# Altium footprint library Connector.PcbLib: 59 footprints (part 3 of 4)
Each footprint in its own frame and in the unit in brackets; x right, y up, seen from the top. Pads: shape width x height; smd on the part's side, far side on the other; paste and mask are expansions set on the pad; w line width, h text height; cw(c..) or ccw(c..) is an arc to the next point about the centre after c.
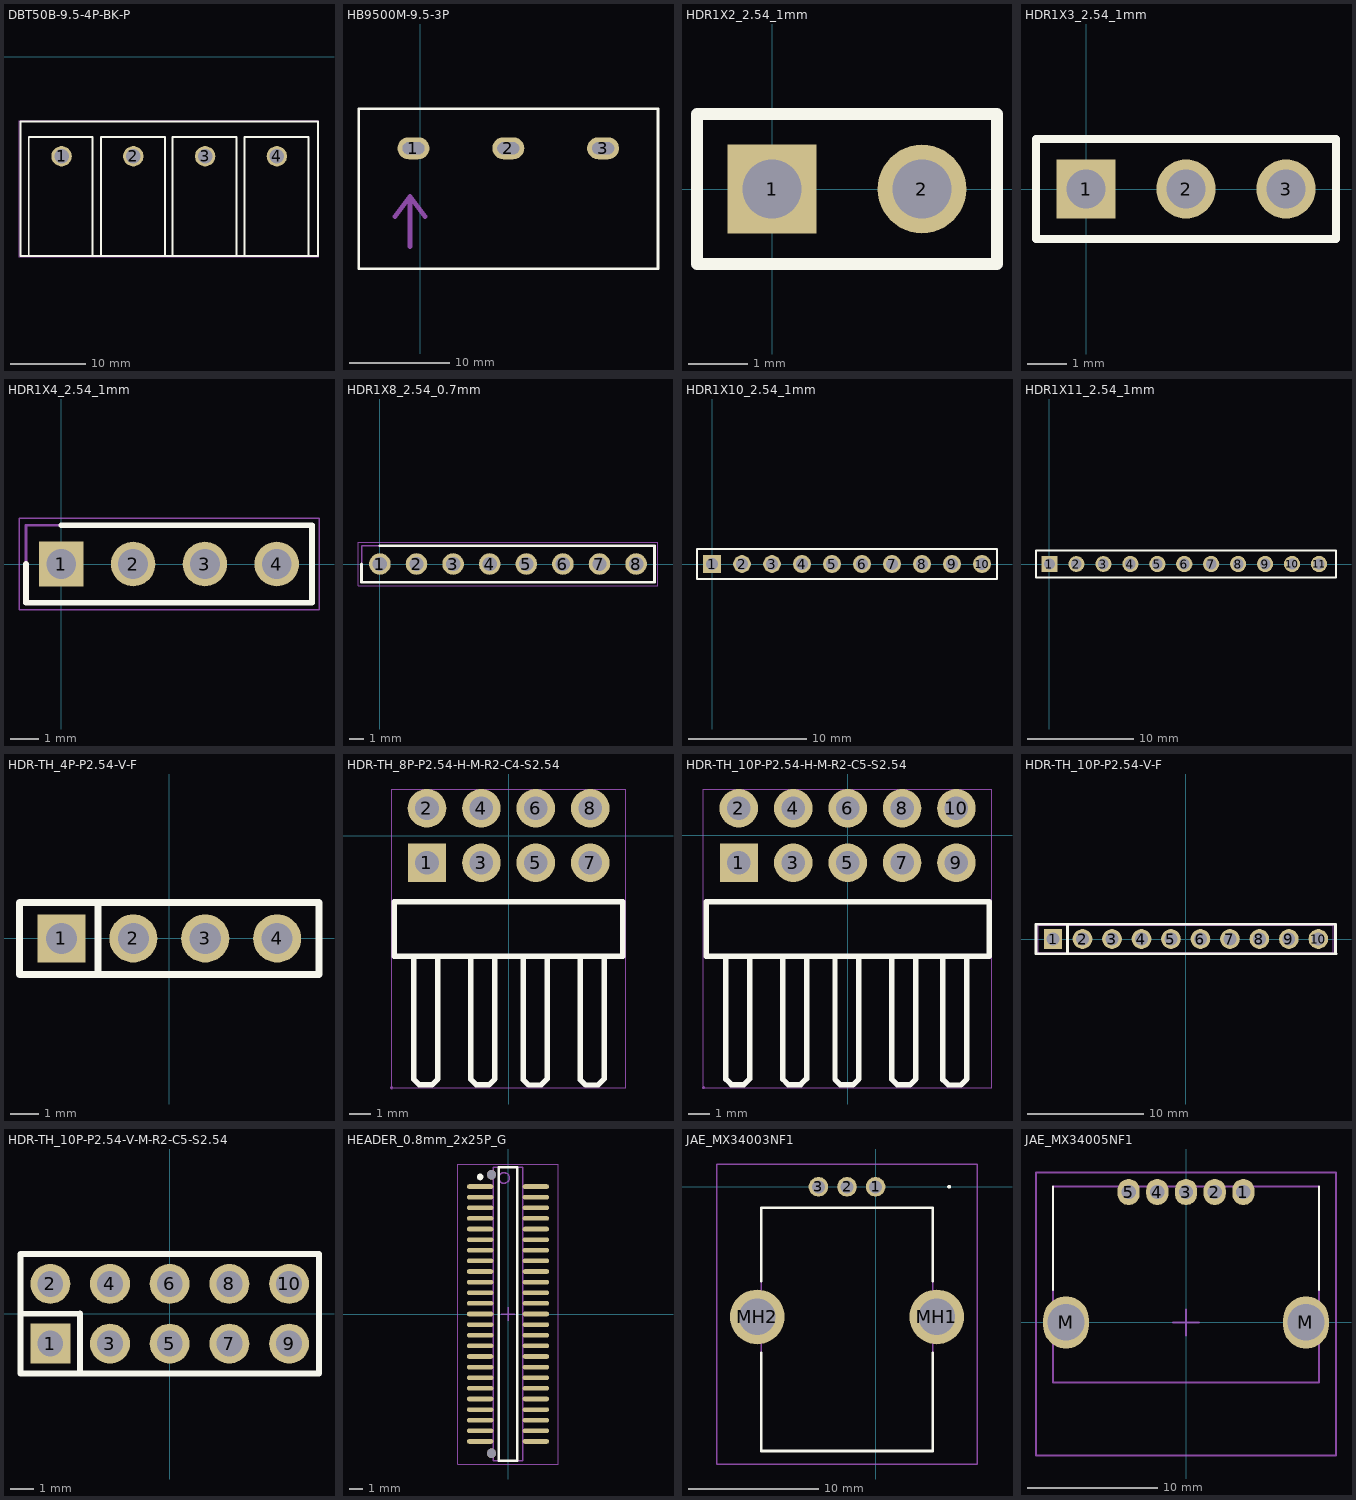
[diagram p2: the footprints below, top view; thin cyan lines are the x and y axes]

## DBT50B-9.5-4P-BK-P [mil]
pads (4):
  round 106.3 hole 74.8 mask+2: 1(1857,-517.6) 2(2231,-517.6) 3(2605,-517.6) 4(2979,-517.6)
Top Overlay:
  lines w10: 1685.9,-1037.3 1685.9,-417.6 2018,-417.6 2018,-1037.3 ; 2063,-1037.6 2063,-417.9 2395.2,-417.9 2395.2,-1037.6 ; 2436,-1037.6 2436,-417.9 2768.1,-417.9 2768.1,-1037.6 ; 2811,-1037.6 2811,-417.9 3143.1,-417.9 3143.1,-1037.6 ; 1642.4,-1037.3 1642.4,-336.5 3193.6,-336.5 3193.6,-1037.3 1642.4,-1037.3
Mechanical 15:
  region: 1890.5,-517.6 1890.5,-513.19 1888.22,-504.67 1883.81,-497.03 1877.57,-490.79 1869.93,-486.38 1861.41,-484.1 1852.59,-484.1 1844.07,-486.38 1836.43,-490.79 1830.19,-497.03 1825.78,-504.67 1823.5,-513.19 1823.5,-517.6 1823.5,-522.01 1825.78,-530.53 1830.19,-538.17 1836.43,-544.41 1844.07,-548.82 1852.59,-551.1 1861.41,-551.1 1869.93,-548.82 1877.57,-544.41 1883.81,-538.17 1888.22,-530.53 1890.5,-522.01
  region: 2264.5,-517.6 2264.5,-513.19 2262.22,-504.67 2257.81,-497.03 2251.57,-490.79 2243.93,-486.38 2235.41,-484.1 2226.59,-484.1 2218.07,-486.38 2210.43,-490.79 2204.19,-497.03 2199.78,-504.67 2197.5,-513.19 2197.5,-517.6 2197.5,-522.01 2199.78,-530.53 2204.19,-538.17 2210.43,-544.41 2218.07,-548.82 2226.59,-551.1 2235.41,-551.1 2243.93,-548.82 2251.57,-544.41 2257.81,-538.17 2262.22,-530.53 2264.5,-522.01
  region: 2638.5,-517.6 2638.5,-513.19 2636.22,-504.67 2631.81,-497.03 2625.57,-490.79 2617.93,-486.38 2609.41,-484.1 2600.59,-484.1 2592.07,-486.38 2584.43,-490.79 2578.19,-497.03 2573.78,-504.67 2571.5,-513.19 2571.5,-517.6 2571.5,-522.01 2573.78,-530.53 2578.19,-538.17 2584.43,-544.41 2592.07,-548.82 2600.59,-551.1 2609.41,-551.1 2617.93,-548.82 2625.57,-544.41 2631.81,-538.17 2636.22,-530.53 2638.5,-522.01
  region: 3012.5,-517.6 3012.5,-513.19 3010.22,-504.67 3005.81,-497.03 2999.57,-490.79 2991.93,-486.38 2983.41,-484.1 2974.59,-484.1 2966.07,-486.38 2958.43,-490.79 2952.19,-497.03 2947.78,-504.67 2945.5,-513.19 2945.5,-517.6 2945.5,-522.01 2947.78,-530.53 2952.19,-538.17 2958.43,-544.41 2966.07,-548.82 2974.59,-551.1 2983.41,-551.1 2991.93,-548.82 2999.57,-544.41 3005.81,-538.17 3010.22,-530.53 3012.5,-522.01
  region: 1639.8,-1042.6 1639.8,-1041.61 1638.39,-1040.2 1636.41,-1040.2 1635,-1041.61 1635,-1042.6 1635,-1043.59 1636.41,-1045 1638.39,-1045 1639.8,-1043.59
  lines w2: 1637.4,-1042.6 3198.6,-1042.6 3198.6,-331.5 1637.4,-331.5 1637.4,-1042.6
3D body: height 10, standoff 0, extent 1642.4,-1037.3 3193.6,-336.5

## HB9500M-9.5-3P [mm]
pads (3):
  oval 3.2x2.2 hole 1.2 slot 2.2 at 0 deg copper offset 0,-0.001 mask+0.051: 1(-0.663,-36.657)
  oval 3.2x2.2 hole 1.2 slot 2.2 at 0 deg mask+0.051: 2(8.837,-36.658) 3(18.337,-36.658)
Top Overlay:
  lines w0.254: -6.163,-48.708 23.837,-48.708 23.837,-32.708 -6.163,-32.708 -6.163,-48.708
Mechanical 7:
  lines w0.5: -2.5,-43.5 -1,-41.5 ; -1,-46.5 -1,-41.5 ; 0.5,-43.5 -1,-41.5
  text "the direction of wire in" at 3.36,-44.142 h2
Mechanical 15:
  region: -6.103,-48.708 -6.103,-48.683 -6.138,-48.648 -6.188,-48.648 -6.223,-48.683 -6.223,-48.708 -6.223,-48.733 -6.188,-48.768 -6.138,-48.768 -6.103,-48.733
  region: 17.836,-36.178 18.837,-36.178 18.837,-37.138 17.836,-37.138
  region: 8.337,-36.178 9.337,-36.178 9.337,-37.138 8.337,-37.138
  region: -1.163,-36.179 -0.163,-36.179 -0.163,-37.139 -1.163,-37.139
  lines w0.051: -6.163,-48.708 23.837,-48.708 23.837,-32.708 -6.163,-32.708 -6.163,-48.708
3D body: height 16.8, standoff 0, extent -6.163,-48.708 23.837,-32.708

## HDR1X2_2.54_1mm [mm] "Connector; Header; 2 Position"
pads (2):
  rect 1.5x1.5 hole 1: 1(0,0)
  round 1.5 hole 1: 2(2.54,0)
Top Overlay:
  lines w0.2: -1.27,-1.27 3.81,-1.27 3.81,1.27 -1.27,1.27 -1.27,-1.27

## HDR1X3_2.54_1mm [mm] "Connector; Header; 3 Position"
pads (3):
  rect 1.5x1.5 hole 1: 1(0,0)
  round 1.5 hole 1: 2(2.54,0) 3(5.08,0)
Top Overlay:
  lines w0.2: -1.27,-1.27 -1.27,1.27 6.35,1.27 6.35,-1.27 -1.27,-1.27

## HDR1X4_2.54_1mm [mm]
pads (4):
  rect 1.575x1.575 hole 1.05: 1(0,0)
  round 1.575 hole 1.05: 2(2.54,0) 3(5.08,0) 4(7.62,0)
Top Overlay:
  lines w0.2: -1.245,0 -1.245,-1.37 8.865,-1.37 8.865,1.37 0,1.37
Mechanical 13:
  lines w0.1: -1.245,-1.37 8.865,-1.37 8.865,1.37 -1.245,1.37 -1.245,-1.37
Mechanical 15:
  lines w0.05: -1.495,-1.62 9.115,-1.62 9.115,1.62 -1.495,1.62 -1.495,-1.62
3D body "0022032041.stp": height 10.66, standoff -3.56, extent -1.153,-1.191 8.753,1.171

## HDR1X8_2.54_0.7mm [mm]
pads (8):
  round 1.5 hole 1: 1(0,0) 2(2.54,0) 3(5.08,0) 4(7.62,0) 5(10.16,0) 6(12.7,0) 7(15.24,0) 8(17.78,0)
Top Overlay:
  lines w0.2: -1.27,0 -1.27,-1.27 19.05,-1.27 19.05,1.27 0,1.27
Mechanical 13:
  lines w0.1: -1.27,-1.27 19.05,-1.27 19.05,1.27 -1.27,1.27 -1.27,-1.27
Mechanical 15:
  lines w0.05: -1.52,-1.52 19.3,-1.52 19.3,1.52 -1.52,1.52 -1.52,-1.52
3D body "08-0625-70.stp": height 8.16, standoff -3.96, extent -1.27,-1.27 19.05,1.27

## HDR1X10_2.54_1mm [mm]
pads (10):
  rect 1.5x1.5 hole 1: 1(0,0)
  round 1.5 hole 1: 2(2.54,0) 3(5.08,0)
  round 1.524 hole 1: 4(7.62,0) 5(10.16,0) 6(12.7,0) 7(15.24,0) 8(17.78,0) 9(20.32,0) 10(22.86,0)
Top Overlay:
  lines w0.2: -1.27,-1.27 -1.27,1.27 24.13,1.27 24.13,-1.27 -1.27,-1.27

## HDR1X11_2.54_1mm [mm]
pads (11):
  rect 1.5x1.5 hole 1: 1(0,0)
  round 1.5 hole 1: 2(2.54,0) 3(5.08,0)
  round 1.524 hole 1: 4(7.62,0) 5(10.16,0) 6(12.7,0) 7(15.24,0) 8(17.78,0) 9(20.32,0) 10(22.86,0) 11(25.4,0)
Top Overlay:
  lines w0.2: -1.27,-1.27 27,-1.27 27,1.27 -1.27,1.27 -1.27,-1.27

## HDR-TH_4P-P2.54-V-F [mm]
pads (4):
  rect 1.7x1.7 hole 1.1: 1(-3.81,0)
  round 1.7 hole 1.1: 2(-1.27,0) 3(1.27,0) 4(3.81,0)
Top Overlay:
  lines w0.254: -2.516,-1.27 -2.516,1.27 ; -5.29,-1.27 -5.29,1.27 5.29,1.27 5.29,-1.27 -5.29,-1.27
Mechanical 15:
  region: -4.13,0.15 -3.49,0.15 -3.49,-0.15 -4.13,-0.15
  region: -1.59,0.15 -0.95,0.15 -0.95,-0.15 -1.59,-0.15
  region: 0.95,0.15 1.59,0.15 1.59,-0.15 0.95,-0.15
  region: 3.49,0.15 4.13,0.15 4.13,-0.15 3.49,-0.15
  region: -5.19,-1.25 -5.19,-1.225 -5.225,-1.19 -5.275,-1.19 -5.31,-1.225 -5.31,-1.25 -5.31,-1.275 -5.275,-1.31 -5.225,-1.31 -5.19,-1.275 -5.19,-1.25
  lines w0.051: -5.25,-1.25 -5.25,1.25 5.25,1.25 5.25,-1.25 -5.25,-1.25

## HDR-TH_8P-P2.54-H-M-R2-C4-S2.54 [mm]
pads (8):
  rect 1.778x1.8 hole 1.1: 1(-3.81,-1.27)
  round 1.8 hole 1.1: 2(-3.81,1.27) 3(-1.27,-1.27) 4(-1.27,1.27) 5(1.27,-1.27) 6(1.27,1.27) 7(3.81,-1.27) 8(3.81,1.27)
Top Overlay:
  lines w0.254: -4.417,-5.63 -4.417,-11.376 -4.163,-11.63 -3.579,-11.63 -3.3,-11.351 -3.3,-5.63 ; -1.76,-5.63 -1.76,-11.376 -1.506,-11.63 -0.922,-11.63 -0.642,-11.351 -0.642,-5.63 ; 0.68,-5.64 0.68,-11.386 0.934,-11.64 1.518,-11.64 1.798,-11.361 1.798,-5.64 ; 3.338,-5.64 3.338,-11.386 3.592,-11.64 4.176,-11.64 4.455,-11.361 4.455,-5.64 ; -5.334,-5.63 -5.334,-3.09 5.334,-3.09 5.334,-5.63 -5.24,-5.63 -5.334,-5.63
Mechanical 15:
  drawing of 13 lines, arcs and shapes, not listed

## HDR-TH_10P-P2.54-H-M-R2-C5-S2.54 [mm]
pads (10):
  rect 1.778x1.8 hole 1.1: 1(-5.08,-1.27)
  round 1.8 hole 1.1: 2(-5.08,1.27) 3(-2.54,-1.27) 4(-2.54,1.27) 5(0,-1.27) 6(0,1.27) 7(2.54,-1.27) 8(2.54,1.27) 9(5.08,-1.27) 10(5.08,1.27)
Top Overlay:
  lines w0.254: -5.687,-5.63 -5.687,-11.376 -5.433,-11.63 -4.849,-11.63 -4.57,-11.351 -4.57,-5.63 ; -3.03,-5.63 -3.03,-11.376 -2.776,-11.63 -2.192,-11.63 -1.912,-11.351 -1.912,-5.63 ; -0.59,-5.64 -0.59,-11.386 -0.336,-11.64 0.248,-11.64 0.528,-11.361 0.528,-5.64 ; 2.068,-5.64 2.068,-11.386 2.322,-11.64 2.906,-11.64 3.185,-11.361 3.185,-5.64 ; 4.45,-5.65 4.45,-11.396 4.704,-11.65 5.288,-11.65 5.568,-11.371 5.568,-5.65 ; -6.604,-5.63 -6.604,-3.09 6.604,-3.09 6.604,-5.63 -6.51,-5.63 -6.604,-5.63
Mechanical 15:
  drawing of 15 lines, arcs and shapes, not listed

## HDR-TH_10P-P2.54-V-F [mm]
pads (10):
  rect 1.575x1.7 hole 1.1: 1(-11.43,0)
  round 1.7 hole 1.1: 2(-8.89,0) 3(-6.35,0) 4(-3.81,0) 5(-1.27,0) 6(1.27,0) 7(3.81,0) 8(6.35,0) 9(8.89,0) 10(11.43,0)
Top Overlay:
  lines w0.254: -10.169,-1.27 -10.169,1.27 ; 12.9,-1.27 12.9,1.27 -12.9,1.27 -12.9,-1.27 12.954,-1.27
Mechanical 15:
  region: -12.64,-1.2 -12.64,-1.175 -12.675,-1.14 -12.725,-1.14 -12.76,-1.175 -12.76,-1.2 -12.76,-1.225 -12.725,-1.26 -12.675,-1.26 -12.64,-1.225 -12.64,-1.2
  region: -11.75,-0.2 -11.75,0.2 -11.11,0.2 -11.11,-0.2
  region: -9.21,0.2 -8.57,0.2 -8.57,-0.2 -9.21,-0.2
  region: -6.67,0.2 -6.03,0.2 -6.03,-0.2 -6.67,-0.2
  region: -4.13,0.2 -3.49,0.2 -3.49,-0.2 -4.13,-0.2
  region: -1.59,0.2 -0.95,0.2 -0.95,-0.2 -1.59,-0.2
  region: 0.95,0.2 1.59,0.2 1.59,-0.2 0.95,-0.2
  region: 3.49,0.2 4.13,0.2 4.13,-0.2 3.49,-0.2
  region: 6.03,0.2 6.67,0.2 6.67,-0.2 6.03,-0.2
  region: 8.57,0.2 9.21,0.2 9.21,-0.2 8.57,-0.2
  region: 11.11,0.2 11.75,0.2 11.75,-0.2 11.11,-0.2
  lines w0.051: -12.7,-1.2 12.7,-1.2 12.7,0 12.7,1.2 -12.7,1.2 -12.7,-1.2

## HDR-TH_10P-P2.54-V-M-R2-C5-S2.54 [mm]
pads (10):
  rect 1.7x1.7 hole 1.1: 1(-5.08,-1.27)
  round 1.7 hole 1.1: 2(-5.08,1.27) 3(-2.54,-1.27) 4(-2.54,1.27) 5(0,-1.27) 6(0,1.27) 7(2.54,-1.27) 8(2.54,1.27) 9(5.08,-1.27) 10(5.08,1.27)
Top Overlay:
  lines w0.254: -6.35,0 -3.81,0.007 -3.81,-2.54 ; -6.35,-2.54 -6.35,2.54 6.35,2.54 6.35,-2.54 -6.35,-2.54
Mechanical 15:
  region: 4.76,-0.95 5.4,-0.95 5.4,-1.59 4.76,-1.59
  region: 4.76,1.59 5.4,1.59 5.4,0.95 4.76,0.95
  region: 2.22,-0.95 2.86,-0.95 2.86,-1.59 2.22,-1.59
  region: 2.22,1.59 2.86,1.59 2.86,0.95 2.22,0.95
  region: -0.32,-0.95 0.32,-0.95 0.32,-1.59 -0.32,-1.59
  region: -0.32,1.59 0.32,1.59 0.32,0.95 -0.32,0.95
  region: -2.86,-0.95 -2.22,-0.95 -2.22,-1.59 -2.86,-1.59
  region: -2.86,1.59 -2.22,1.59 -2.22,0.95 -2.86,0.95
  region: -5.4,-0.95 -4.76,-0.95 -4.76,-1.59 -5.4,-1.59
  region: -5.4,1.59 -4.76,1.59 -4.76,0.95 -5.4,0.95
  region: -6.29,-2.5 -6.29,-2.475 -6.325,-2.44 -6.375,-2.44 -6.41,-2.475 -6.41,-2.5 -6.41,-2.525 -6.375,-2.56 -6.325,-2.56 -6.29,-2.525 -6.29,-2.5
  lines w0.051: -6.35,-2.5 6.35,-2.5 6.35,2.5 -6.35,2.5 -6.35,-2.5

## HEADER_0.8mm_2x25P_G [mm] "0.8间距2x25P公座，SMD"
height 2
pads (50):
  oval 2x0.35 smd: 1(-2.1,9.6) 2(-2.1,8.8) 3(-2.1,8) 4(-2.1,7.2) 5(-2.1,6.4) 6(-2.1,5.6) 7(-2.1,4.8) 8(-2.1,4) 9(-2.1,3.2) 10(-2.1,2.4) 11(-2.1,1.6) 12(-2.1,0.8) 13(-2.1,0) 14(-2.1,-0.8) 15(-2.1,-1.6) 16(-2.1,-2.4) 17(-2.1,-3.2) 18(-2.1,-4) 19(-2.1,-4.8) 20(-2.1,-5.6) 21(-2.1,-6.4) 22(-2.1,-7.2) 23(-2.1,-8) 24(-2.1,-8.8) 25(-2.1,-9.6) 26(2.1,-9.6) 27(2.1,-8.8) 28(2.1,-8) 29(2.1,-7.2) 30(2.1,-6.4) 31(2.1,-5.6) 32(2.1,-4.8) 33(2.1,-4) 34(2.1,-3.2) 35(2.1,-2.4) 36(2.1,-1.6) 37(2.1,-0.8) 38(2.1,0) 39(2.1,0.8) 40(2.1,1.6) 41(2.1,2.4) 42(2.1,3.2) 43(2.1,4) 44(2.1,4.8) 45(2.1,5.6) 46(2.1,6.4) 47(2.1,7.2) 48(2.1,8) 49(2.1,8.8) 50(2.1,9.6)
via -1.25,10.5 diameter 0.7 hole 0.7
via -1.25,-10.5 diameter 0.7 hole 0.7
Top Overlay:
  circle w0.25: c-2.1,10.325 r0.125
  lines w0.2: -0.7,-11.05 -0.7,11.05 0.7,11.05 0.7,-11.05 -0.7,-11.05
Mechanical 13:
  circle w0.1: c-0.3,10.25 r0.4
  lines w0.1: -1.1,-11.05 -1.1,11.05 1.1,11.05 1.1,-11.05 -1.1,-11.05
Mechanical 15:
  lines w0.05: -3.8,-11.3 -3.8,11.3 3.8,11.3 3.8,-11.3 -3.8,-11.3
  lines w0.1: -0.5,0 0.5,0 ; 0,-0.5 0,0.5
3D body: height 2, standoff 0.1, extent -1.1,-11.05 1.1,11.05

## JAE_MX34003NF1 [mm]
pads (5):
  round 1.5 hole 1: 1(0,0) 2(-2.2,0) 3(-4.4,0)
  round 4.2 hole 2.8: MH1(4.7,-10) MH2(-9.1,-10)
Top Overlay:
  lines w0.2: -8.8,-12.75 -8.8,-20.3 4.4,-20.3 4.4,-12.75 ; -8.8,-7.25 -8.8,-1.6 4.4,-1.6 4.4,-7.25 ; 5.6,0 cw(c5.65,0) 5.7,0 ; 5.6,0 ccw(c5.65,0) 5.7,0 ; 5.6,0 cw(c5.65,0) 5.7,0
Mechanical 15:
  lines w0.1: -8.8,-20.3 4.4,-20.3 4.4,-1.6 -8.8,-1.6 -8.8,-20.3
Mechanical 20:
  lines w0.1: -12.2,-21.3 7.8,-21.3 7.8,1.75 -12.2,1.75 -12.2,-21.3
3D body "MX34003NF1.stp": height 11.3, standoff -5, extent -10.39,-20.3 6,0.399

## JAE_MX34005NF1 [mm]
pads (7):
  oval 1.7x2 hole 1.1: 1(4.4,10) 2(2.2,10) 3(0,10) 4(-2.2,10) 5(-4.4,10)
  oval 3.5x4 hole 2.8: M(-9.2,0) M(9.2,0)
Top Overlay:
  lines w0.152: -10.2,2.5 -10.2,10.42 ; 10.2,2.5 10.2,10.42
Mechanical 13:
  lines w0.152: -10.2,-4.6 0,-4.6 10.2,-4.6 10.2,10.42 0,10.42 -10.2,10.42 -10.2,-4.6
Mechanical 15:
  lines w0.152: -1,0 1,0 ; 0,-1 0,1 ; -11.5,-10.2 -11.5,11.5 0,11.5 11.5,11.5 11.5,-10.2 0,-10.2 -11.5,-10.2
3D body "K3D-MX34005NF1-V1_JAE_Proprietary.STEP": height 10.7, standoff -3.2, extent -10.2,-10.2 10.2,10.42
3D body "K3D-MX34005SF1-V3_JAE_Proprietary.STEP": height 12.9, standoff 0.7, extent -7.6,-18 7.6,3.3